# Altium schematic symbol library jlcpcb_2025_04_resistors_extended_2010.schlib: 1697 symbols (part 3 of 9)
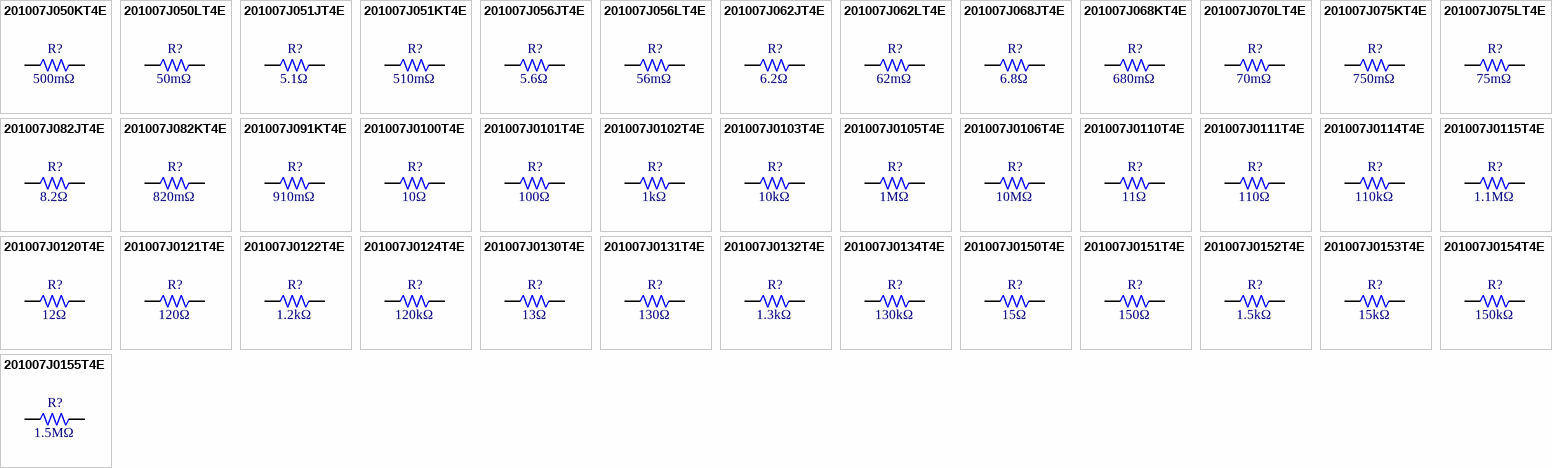
[diagram p44: symbols 201007J050KT4E to 201007J0155T4E]

## 201007J0130T4E
designator R?  Resistance: 13Ω  (hidden comment: *)
Resistor, 13Ω, ±5%, 750mW, 200V, ±200ppm/℃, -55℃~+155℃, SMD 2010; Manufacturer: Uniroyal; Manufacturer Part Number: 201007J0130T4E; Supplier 1: LCSC; Supplier Part Number 1: C406995; JLCPCB Part Number: C406995; Power Rating: 750mW; Category: Resistors; Package Size: 2010; JLCPCB Basic Part: Yes; Tolerance: ±5%; Voltage Rating: 200V; Temperature Coefficient: ±200ppm/℃; Temperature Rating: -55℃~+155℃; ComponentLink1Description: Datasheet; ComponentLink1URL: https://wmsc.lcsc.com/wmsc/upload/file/pdf/v2/lcsc/2205311945_UNI-ROYAL-Uniroyal-Elec-201007J0130T4E_C406995.pdf; ComponentLink2Description: JLCPCB Part URL; ComponentLink2URL: https://jlcpcb.com/partdetail/C406995
pins: 1, 2
1 alternate drawing of the same symbol

## 201007J0131T4E
designator R?  Resistance: 130Ω  (hidden comment: *)
Resistor, 130Ω, ±5%, 750mW, 200V, ±100ppm/℃, -55℃~+155℃, SMD 2010; Manufacturer: Uniroyal; Manufacturer Part Number: 201007J0131T4E; Supplier 1: LCSC; Supplier Part Number 1: C406994; JLCPCB Part Number: C406994; Power Rating: 750mW; Category: Resistors; Package Size: 2010; JLCPCB Basic Part: Yes; Tolerance: ±5%; Voltage Rating: 200V; Temperature Coefficient: ±100ppm/℃; Temperature Rating: -55℃~+155℃; ComponentLink1Description: Datasheet; ComponentLink1URL: https://wmsc.lcsc.com/wmsc/upload/file/pdf/v2/lcsc/2205312300_UNI-ROYAL-Uniroyal-Elec-201007J0131T4E_C406994.pdf; ComponentLink2Description: JLCPCB Part URL; ComponentLink2URL: https://jlcpcb.com/partdetail/C406994
pins: 1, 2
1 alternate drawing of the same symbol

## 201007J0132T4E
designator R?  Resistance: 1.3kΩ  (hidden comment: *)
Resistor, 1.3kΩ, ±5%, 750mW, 200V, ±100ppm/℃, -55℃~+155℃, SMD 2010; Manufacturer: Uniroyal; Manufacturer Part Number: 201007J0132T4E; Supplier 1: LCSC; Supplier Part Number 1: C421747; JLCPCB Part Number: C421747; Power Rating: 750mW; Category: Resistors; Package Size: 2010; JLCPCB Basic Part: Yes; Tolerance: ±5%; Voltage Rating: 200V; Temperature Coefficient: ±100ppm/℃; Temperature Rating: -55℃~+155℃; ComponentLink1Description: Datasheet; ComponentLink1URL: https://wmsc.lcsc.com/wmsc/upload/file/pdf/v2/lcsc/2205312000_UNI-ROYAL-Uniroyal-Elec-201007J0132T4E_C421747.pdf; ComponentLink2Description: JLCPCB Part URL; ComponentLink2URL: https://jlcpcb.com/partdetail/C421747
pins: 1, 2
1 alternate drawing of the same symbol

## 201007J0134T4E
designator R?  Resistance: 130kΩ  (hidden comment: *)
Resistor, 130kΩ, ±5%, 750mW, 200V, ±100ppm/℃, -55℃~+155℃, SMD 2010; Manufacturer: Uniroyal; Manufacturer Part Number: 201007J0134T4E; Supplier 1: LCSC; Supplier Part Number 1: C621164; JLCPCB Part Number: C621164; Power Rating: 750mW; Category: Resistors; Package Size: 2010; JLCPCB Basic Part: Yes; Tolerance: ±5%; Voltage Rating: 200V; Temperature Coefficient: ±100ppm/℃; Temperature Rating: -55℃~+155℃; ComponentLink1Description: Datasheet; ComponentLink1URL: https://wmsc.lcsc.com/wmsc/upload/file/pdf/v2/lcsc/2206011100_UNI-ROYAL-Uniroyal-Elec-201007J0134T4E_C621164.pdf; ComponentLink2Description: JLCPCB Part URL; ComponentLink2URL: https://jlcpcb.com/partdetail/C621164
pins: 1, 2
1 alternate drawing of the same symbol

## 201007J0150T4E
designator R?  Resistance: 15Ω  (hidden comment: *)
Resistor, 15Ω, ±5%, 750mW, 200V, ±100ppm/℃, -55℃~+155℃, SMD 2010; Manufacturer: Uniroyal; Manufacturer Part Number: 201007J0150T4E; Supplier 1: LCSC; Supplier Part Number 1: C473640; JLCPCB Part Number: C473640; Power Rating: 750mW; Category: Resistors; Package Size: 2010; JLCPCB Basic Part: Yes; Tolerance: ±5%; Voltage Rating: 200V; Temperature Coefficient: ±100ppm/℃; Temperature Rating: -55℃~+155℃; ComponentLink1Description: Datasheet; ComponentLink1URL: https://wmsc.lcsc.com/wmsc/upload/file/pdf/v2/lcsc/2206011100_UNI-ROYAL-Uniroyal-Elec-201007J0150T4E_C473640.pdf; ComponentLink2Description: JLCPCB Part URL; ComponentLink2URL: https://jlcpcb.com/partdetail/C473640
pins: 1, 2
1 alternate drawing of the same symbol

## 201007J0151T4E
designator R?  Resistance: 150Ω  (hidden comment: *)
Resistor, 150Ω, ±5%, 750mW, 200V, ±100ppm/℃, -55℃~+155℃, SMD 2010; Manufacturer: Uniroyal; Manufacturer Part Number: 201007J0151T4E; Supplier 1: LCSC; Supplier Part Number 1: C270962; JLCPCB Part Number: C270962; Power Rating: 750mW; Category: Resistors; Package Size: 2010; JLCPCB Basic Part: Yes; Tolerance: ±5%; Voltage Rating: 200V; Temperature Coefficient: ±100ppm/℃; Temperature Rating: -55℃~+155℃; ComponentLink1Description: Datasheet; ComponentLink1URL: https://wmsc.lcsc.com/wmsc/upload/file/pdf/v2/lcsc/2205311945_UNI-ROYAL-Uniroyal-Elec-201007J0151T4E_C270962.pdf; ComponentLink2Description: JLCPCB Part URL; ComponentLink2URL: https://jlcpcb.com/partdetail/C270962
pins: 1, 2
1 alternate drawing of the same symbol

## 201007J0152T4E
designator R?  Resistance: 1.5kΩ  (hidden comment: *)
Resistor, 1.5kΩ, ±5%, 750mW, 200V, ±100ppm/℃, -55℃~+155℃, SMD 2010; Manufacturer: Uniroyal; Manufacturer Part Number: 201007J0152T4E; Supplier 1: LCSC; Supplier Part Number 1: C621149; JLCPCB Part Number: C621149; Power Rating: 750mW; Category: Resistors; Package Size: 2010; JLCPCB Basic Part: Yes; Tolerance: ±5%; Voltage Rating: 200V; Temperature Coefficient: ±100ppm/℃; Temperature Rating: -55℃~+155℃; ComponentLink1Description: Datasheet; ComponentLink1URL: https://wmsc.lcsc.com/wmsc/upload/file/pdf/v2/lcsc/2206011100_UNI-ROYAL-Uniroyal-Elec-201007J0152T4E_C621149.pdf; ComponentLink2Description: JLCPCB Part URL; ComponentLink2URL: https://jlcpcb.com/partdetail/C621149
pins: 1, 2
1 alternate drawing of the same symbol

## 201007J0153T4E
designator R?  Resistance: 15kΩ  (hidden comment: *)
Resistor, 15kΩ, ±5%, 750mW, 200V, ±100ppm/℃, -55℃~+155℃, SMD 2010; Manufacturer: Uniroyal; Manufacturer Part Number: 201007J0153T4E; Supplier 1: LCSC; Supplier Part Number 1: C396642; JLCPCB Part Number: C396642; Power Rating: 750mW; Category: Resistors; Package Size: 2010; JLCPCB Basic Part: Yes; Tolerance: ±5%; Voltage Rating: 200V; Temperature Coefficient: ±100ppm/℃; Temperature Rating: -55℃~+155℃; ComponentLink1Description: Datasheet; ComponentLink1URL: https://wmsc.lcsc.com/wmsc/upload/file/pdf/v2/lcsc/2205311945_UNI-ROYAL-Uniroyal-Elec-201007J0153T4E_C396642.pdf; ComponentLink2Description: JLCPCB Part URL; ComponentLink2URL: https://jlcpcb.com/partdetail/C396642
pins: 1, 2
1 alternate drawing of the same symbol

## 201007J0154T4E
designator R?  Resistance: 150kΩ  (hidden comment: *)
Resistor, 150kΩ, ±5%, 750mW, 200V, ±100ppm/℃, -55℃~+155℃, SMD 2010; Manufacturer: Uniroyal; Manufacturer Part Number: 201007J0154T4E; Supplier 1: LCSC; Supplier Part Number 1: C421744; JLCPCB Part Number: C421744; Power Rating: 750mW; Category: Resistors; Package Size: 2010; JLCPCB Basic Part: Yes; Tolerance: ±5%; Voltage Rating: 200V; Temperature Coefficient: ±100ppm/℃; Temperature Rating: -55℃~+155℃; ComponentLink1Description: Datasheet; ComponentLink1URL: https://wmsc.lcsc.com/wmsc/upload/file/pdf/v2/lcsc/2205312000_UNI-ROYAL-Uniroyal-Elec-201007J0154T4E_C421744.pdf; ComponentLink2Description: JLCPCB Part URL; ComponentLink2URL: https://jlcpcb.com/partdetail/C421744
pins: 1, 2
1 alternate drawing of the same symbol

## 201007J0155T4E
designator R?  Resistance: 1.5MΩ  (hidden comment: *)
Resistor, 1.5MΩ, ±5%, 750mW, 200V, ±100ppm/℃, -55℃~+155℃, SMD 2010; Manufacturer: Uniroyal; Manufacturer Part Number: 201007J0155T4E; Supplier 1: LCSC; Supplier Part Number 1: C421743; JLCPCB Part Number: C421743; Power Rating: 750mW; Category: Resistors; Package Size: 2010; JLCPCB Basic Part: Yes; Tolerance: ±5%; Voltage Rating: 200V; Temperature Coefficient: ±100ppm/℃; Temperature Rating: -55℃~+155℃; ComponentLink1Description: Datasheet; ComponentLink1URL: https://wmsc.lcsc.com/wmsc/upload/file/pdf/v2/lcsc/2205312000_UNI-ROYAL-Uniroyal-Elec-201007J0155T4E_C421743.pdf; ComponentLink2Description: JLCPCB Part URL; ComponentLink2URL: https://jlcpcb.com/partdetail/C421743
pins: 1, 2
1 alternate drawing of the same symbol

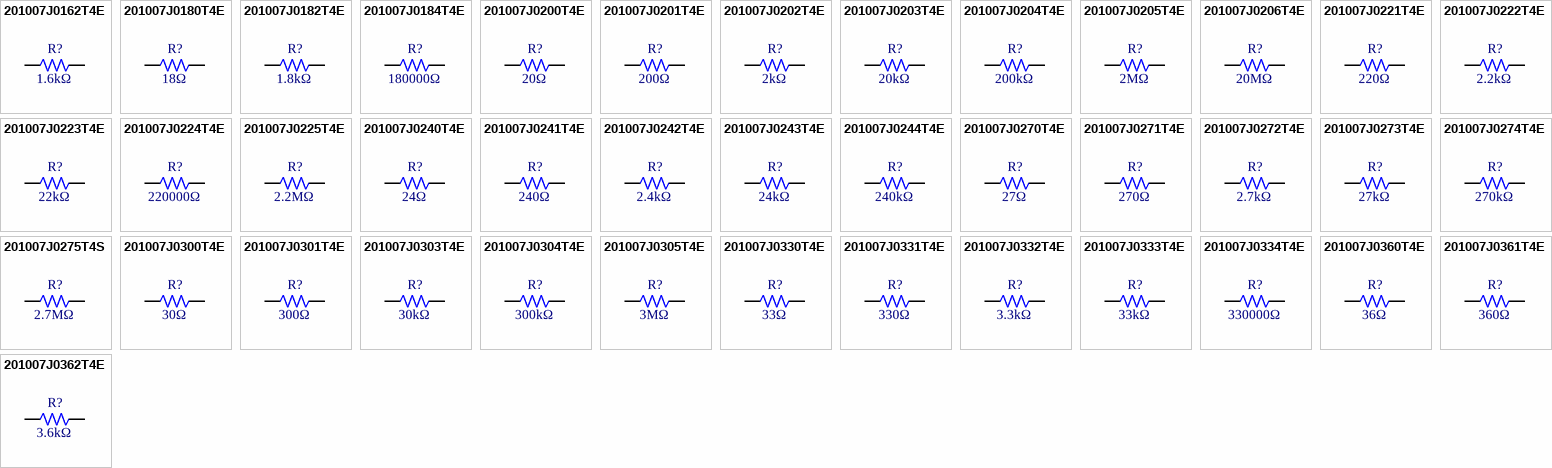
[diagram p10: symbols 201007J0162T4E to 201007J0362T4E]

## 201007J0162T4E
designator R?  Resistance: 1.6kΩ  (hidden comment: *)
Resistor, 1.6kΩ, ±5%, 750mW, 200V, ±100ppm/℃, -55℃~+155℃, SMD 2010; Manufacturer: Uniroyal; Manufacturer Part Number: 201007J0162T4E; Supplier 1: LCSC; Supplier Part Number 1: C621151; JLCPCB Part Number: C621151; Power Rating: 750mW; Category: Resistors; Package Size: 2010; JLCPCB Basic Part: Yes; Tolerance: ±5%; Voltage Rating: 200V; Temperature Coefficient: ±100ppm/℃; Temperature Rating: -55℃~+155℃; ComponentLink1Description: Datasheet; ComponentLink1URL: https://wmsc.lcsc.com/wmsc/upload/file/pdf/v2/lcsc/2206011100_UNI-ROYAL-Uniroyal-Elec-201007J0162T4E_C621151.pdf; ComponentLink2Description: JLCPCB Part URL; ComponentLink2URL: https://jlcpcb.com/partdetail/C621151
pins: 1, 2
1 alternate drawing of the same symbol

## 201007J0180T4E
designator R?  Resistance: 18Ω  (hidden comment: *)
Resistor, 18Ω, ±5%, 750mW, 200V, ±100ppm/℃, -55℃~+155℃, SMD 2010; Manufacturer: Uniroyal; Manufacturer Part Number: 201007J0180T4E; Supplier 1: LCSC; Supplier Part Number 1: C421737; JLCPCB Part Number: C421737; Power Rating: 750mW; Category: Resistors; Package Size: 2010; JLCPCB Basic Part: Yes; Tolerance: ±5%; Voltage Rating: 200V; Temperature Coefficient: ±100ppm/℃; Temperature Rating: -55℃~+155℃; ComponentLink1Description: Datasheet; ComponentLink1URL: https://wmsc.lcsc.com/wmsc/upload/file/pdf/v2/lcsc/2205312000_UNI-ROYAL-Uniroyal-Elec-201007J0180T4E_C421737.pdf; ComponentLink2Description: JLCPCB Part URL; ComponentLink2URL: https://jlcpcb.com/partdetail/C421737
pins: 1, 2
1 alternate drawing of the same symbol

## 201007J0182T4E
designator R?  Resistance: 1.8kΩ  (hidden comment: *)
Resistor, 1.8kΩ, ±5%, 750mW, 200V, ±100ppm/℃, -55℃~+155℃, SMD 2010; Manufacturer: Uniroyal; Manufacturer Part Number: 201007J0182T4E; Supplier 1: LCSC; Supplier Part Number 1: C421735; JLCPCB Part Number: C421735; Power Rating: 750mW; Category: Resistors; Package Size: 2010; JLCPCB Basic Part: Yes; Tolerance: ±5%; Voltage Rating: 200V; Temperature Coefficient: ±100ppm/℃; Temperature Rating: -55℃~+155℃; ComponentLink1Description: Datasheet; ComponentLink1URL: https://wmsc.lcsc.com/wmsc/upload/file/pdf/v2/lcsc/2205312000_UNI-ROYAL-Uniroyal-Elec-201007J0182T4E_C421735.pdf; ComponentLink2Description: JLCPCB Part URL; ComponentLink2URL: https://jlcpcb.com/partdetail/C421735
pins: 1, 2
1 alternate drawing of the same symbol

## 201007J0184T4E
designator R?  Resistance: 180000Ω  (hidden comment: *)
Resistor, 180000Ω, ±5%, 750mW, 200V, ±100ppm/℃, -55℃~+155℃, SMD 2010; Manufacturer: Uniroyal; Manufacturer Part Number: 201007J0184T4E; Supplier 1: LCSC; Supplier Part Number 1: C421734; JLCPCB Part Number: C421734; Power Rating: 750mW; Category: Resistors; Package Size: 2010; JLCPCB Basic Part: Yes; Tolerance: ±5%; Voltage Rating: 200V; Temperature Coefficient: ±100ppm/℃; Temperature Rating: -55℃~+155℃; ComponentLink1Description: Datasheet; ComponentLink1URL: https://wmsc.lcsc.com/wmsc/upload/file/pdf/v2/lcsc/2205312000_UNI-ROYAL-Uniroyal-Elec-201007J0184T4E_C421734.pdf; ComponentLink2Description: JLCPCB Part URL; ComponentLink2URL: https://jlcpcb.com/partdetail/C421734
pins: 1, 2
1 alternate drawing of the same symbol

## 201007J0200T4E
designator R?  Resistance: 20Ω  (hidden comment: *)
Resistor, 20Ω, ±5%, 750mW, 200V, ±100ppm/℃, -55℃~+155℃, SMD 2010; Manufacturer: Uniroyal; Manufacturer Part Number: 201007J0200T4E; Supplier 1: LCSC; Supplier Part Number 1: C473651; JLCPCB Part Number: C473651; Power Rating: 750mW; Category: Resistors; Package Size: 2010; JLCPCB Basic Part: Yes; Tolerance: ±5%; Voltage Rating: 200V; Temperature Coefficient: ±100ppm/℃; Temperature Rating: -55℃~+155℃; ComponentLink1Description: Datasheet; ComponentLink1URL: https://wmsc.lcsc.com/wmsc/upload/file/pdf/v2/lcsc/2206011100_UNI-ROYAL-Uniroyal-Elec-201007J0200T4E_C473651.pdf; ComponentLink2Description: JLCPCB Part URL; ComponentLink2URL: https://jlcpcb.com/partdetail/C473651
pins: 1, 2
1 alternate drawing of the same symbol

## 201007J0201T4E
designator R?  Resistance: 200Ω  (hidden comment: *)
Resistor, 200Ω, ±5%, 750mW, 200V, ±100ppm/℃, -55℃~+155℃, SMD 2010; Manufacturer: Uniroyal; Manufacturer Part Number: 201007J0201T4E; Supplier 1: LCSC; Supplier Part Number 1: C19610; JLCPCB Part Number: C19610; Power Rating: 750mW; Category: Resistors; Package Size: 2010; JLCPCB Basic Part: Yes; Tolerance: ±5%; Voltage Rating: 200V; Temperature Coefficient: ±100ppm/℃; Temperature Rating: -55℃~+155℃; ComponentLink1Description: Datasheet; ComponentLink1URL: https://wmsc.lcsc.com/wmsc/upload/file/pdf/v2/lcsc/2206010145_UNI-ROYAL-Uniroyal-Elec-201007J0201T4E_C19610.pdf; ComponentLink2Description: JLCPCB Part URL; ComponentLink2URL: https://jlcpcb.com/partdetail/C19610
pins: 1, 2
1 alternate drawing of the same symbol

## 201007J0202T4E
designator R?  Resistance: 2kΩ  (hidden comment: *)
Resistor, 2kΩ, ±5%, 750mW, 200V, ±100ppm/℃, -55℃~+155℃, SMD 2010; Manufacturer: Uniroyal; Manufacturer Part Number: 201007J0202T4E; Supplier 1: LCSC; Supplier Part Number 1: C270960; JLCPCB Part Number: C270960; Power Rating: 750mW; Category: Resistors; Package Size: 2010; JLCPCB Basic Part: Yes; Tolerance: ±5%; Voltage Rating: 200V; Temperature Coefficient: ±100ppm/℃; Temperature Rating: -55℃~+155℃; ComponentLink1Description: Datasheet; ComponentLink1URL: https://wmsc.lcsc.com/wmsc/upload/file/pdf/v2/lcsc/2205311945_UNI-ROYAL-Uniroyal-Elec-201007J0202T4E_C270960.pdf; ComponentLink2Description: JLCPCB Part URL; ComponentLink2URL: https://jlcpcb.com/partdetail/C270960
pins: 1, 2
1 alternate drawing of the same symbol

## 201007J0203T4E
designator R?  Resistance: 20kΩ  (hidden comment: *)
Resistor, 20kΩ, ±5%, 750mW, 200V, ±100ppm/℃, -55℃~+155℃, SMD 2010; Manufacturer: Uniroyal; Manufacturer Part Number: 201007J0203T4E; Supplier 1: LCSC; Supplier Part Number 1: C621184; JLCPCB Part Number: C621184; Power Rating: 750mW; Category: Resistors; Package Size: 2010; JLCPCB Basic Part: Yes; Tolerance: ±5%; Voltage Rating: 200V; Temperature Coefficient: ±100ppm/℃; Temperature Rating: -55℃~+155℃; ComponentLink1Description: Datasheet; ComponentLink1URL: https://wmsc.lcsc.com/wmsc/upload/file/pdf/v2/lcsc/2206011100_UNI-ROYAL-Uniroyal-Elec-201007J0203T4E_C621184.pdf; ComponentLink2Description: JLCPCB Part URL; ComponentLink2URL: https://jlcpcb.com/partdetail/C621184
pins: 1, 2
1 alternate drawing of the same symbol

## 201007J0204T4E
designator R?  Resistance: 200kΩ  (hidden comment: *)
Resistor, 200kΩ, ±5%, 750mW, 200V, ±100ppm/℃, -55℃~+155℃, SMD 2010; Manufacturer: Uniroyal; Manufacturer Part Number: 201007J0204T4E; Supplier 1: LCSC; Supplier Part Number 1: C421733; JLCPCB Part Number: C421733; Power Rating: 750mW; Category: Resistors; Package Size: 2010; JLCPCB Basic Part: Yes; Tolerance: ±5%; Voltage Rating: 200V; Temperature Coefficient: ±100ppm/℃; Temperature Rating: -55℃~+155℃; ComponentLink1Description: Datasheet; ComponentLink1URL: https://wmsc.lcsc.com/wmsc/upload/file/pdf/v2/lcsc/2205312000_UNI-ROYAL-Uniroyal-Elec-201007J0204T4E_C421733.pdf; ComponentLink2Description: JLCPCB Part URL; ComponentLink2URL: https://jlcpcb.com/partdetail/C421733
pins: 1, 2
1 alternate drawing of the same symbol

## 201007J0205T4E
designator R?  Resistance: 2MΩ  (hidden comment: *)
Resistor, 2MΩ, ±5%, 750mW, 200V, ±100ppm/℃, -55℃~+155℃, SMD 2010; Manufacturer: Uniroyal; Manufacturer Part Number: 201007J0205T4E; Supplier 1: LCSC; Supplier Part Number 1: C421732; JLCPCB Part Number: C421732; Power Rating: 750mW; Category: Resistors; Package Size: 2010; JLCPCB Basic Part: Yes; Tolerance: ±5%; Voltage Rating: 200V; Temperature Coefficient: ±100ppm/℃; Temperature Rating: -55℃~+155℃; ComponentLink1Description: Datasheet; ComponentLink1URL: https://wmsc.lcsc.com/wmsc/upload/file/pdf/v2/lcsc/2205312000_UNI-ROYAL-Uniroyal-Elec-201007J0205T4E_C421732.pdf; ComponentLink2Description: JLCPCB Part URL; ComponentLink2URL: https://jlcpcb.com/partdetail/C421732
pins: 1, 2
1 alternate drawing of the same symbol

## 201007J0206T4E
designator R?  Resistance: 20MΩ  (hidden comment: *)
Resistor, 20MΩ, ±5%, 750mW, 200V, ±100ppm/℃, -55℃~+155℃, SMD 2010; Manufacturer: Uniroyal; Manufacturer Part Number: 201007J0206T4E; Supplier 1: LCSC; Supplier Part Number 1: C2768917; JLCPCB Part Number: C2768917; Power Rating: 750mW; Category: Resistors; Package Size: 2010; JLCPCB Basic Part: Yes; Tolerance: ±5%; Voltage Rating: 200V; Temperature Coefficient: ±100ppm/℃; Temperature Rating: -55℃~+155℃; ComponentLink1Description: Datasheet; ComponentLink1URL: https://wmsc.lcsc.com/wmsc/upload/file/pdf/v2/lcsc/2206011016_UNI-ROYAL-Uniroyal-Elec-201007J0206T4E_C2768917.pdf; ComponentLink2Description: JLCPCB Part URL; ComponentLink2URL: https://jlcpcb.com/partdetail/C2768917
pins: 1, 2
1 alternate drawing of the same symbol

## 201007J0221T4E
designator R?  Resistance: 220Ω  (hidden comment: *)
Resistor, 220Ω, ±5%, 750mW, 200V, ±100ppm/℃, -55℃~+155℃, SMD 2010; Manufacturer: Uniroyal; Manufacturer Part Number: 201007J0221T4E; Supplier 1: LCSC; Supplier Part Number 1: C621186; JLCPCB Part Number: C621186; Power Rating: 750mW; Category: Resistors; Package Size: 2010; JLCPCB Basic Part: Yes; Tolerance: ±5%; Voltage Rating: 200V; Temperature Coefficient: ±100ppm/℃; Temperature Rating: -55℃~+155℃; ComponentLink1Description: Datasheet; ComponentLink1URL: https://wmsc.lcsc.com/wmsc/upload/file/pdf/v2/lcsc/2206011100_UNI-ROYAL-Uniroyal-Elec-201007J0221T4E_C621186.pdf; ComponentLink2Description: JLCPCB Part URL; ComponentLink2URL: https://jlcpcb.com/partdetail/C621186
pins: 1, 2
1 alternate drawing of the same symbol

## 201007J0222T4E
designator R?  Resistance: 2.2kΩ  (hidden comment: *)
Resistor, 2.2kΩ, ±5%, 750mW, 200V, ±100ppm/℃, -55℃~+155℃, SMD 2010; Manufacturer: Uniroyal; Manufacturer Part Number: 201007J0222T4E; Supplier 1: LCSC; Supplier Part Number 1: C621177; JLCPCB Part Number: C621177; Power Rating: 750mW; Category: Resistors; Package Size: 2010; JLCPCB Basic Part: Yes; Tolerance: ±5%; Voltage Rating: 200V; Temperature Coefficient: ±100ppm/℃; Temperature Rating: -55℃~+155℃; ComponentLink1Description: Datasheet; ComponentLink1URL: https://wmsc.lcsc.com/wmsc/upload/file/pdf/v2/lcsc/2206011100_UNI-ROYAL-Uniroyal-Elec-201007J0222T4E_C621177.pdf; ComponentLink2Description: JLCPCB Part URL; ComponentLink2URL: https://jlcpcb.com/partdetail/C621177
pins: 1, 2
1 alternate drawing of the same symbol

## 201007J0223T4E
designator R?  Resistance: 22kΩ  (hidden comment: *)
Resistor, 22kΩ, ±5%, 750mW, 200V, ±100ppm/℃, -55℃~+155℃, SMD 2010; Manufacturer: Uniroyal; Manufacturer Part Number: 201007J0223T4E; Supplier 1: LCSC; Supplier Part Number 1: C421731; JLCPCB Part Number: C421731; Power Rating: 750mW; Category: Resistors; Package Size: 2010; JLCPCB Basic Part: Yes; Tolerance: ±5%; Voltage Rating: 200V; Temperature Coefficient: ±100ppm/℃; Temperature Rating: -55℃~+155℃; ComponentLink1Description: Datasheet; ComponentLink1URL: https://wmsc.lcsc.com/wmsc/upload/file/pdf/v2/lcsc/2205312000_UNI-ROYAL-Uniroyal-Elec-201007J0223T4E_C421731.pdf; ComponentLink2Description: JLCPCB Part URL; ComponentLink2URL: https://jlcpcb.com/partdetail/C421731
pins: 1, 2
1 alternate drawing of the same symbol

## 201007J0224T4E
designator R?  Resistance: 220000Ω  (hidden comment: *)
Resistor, 220000Ω, ±5%, 750mW, 200V, ±100ppm/℃, -55℃~+155℃, SMD 2010; Manufacturer: Uniroyal; Manufacturer Part Number: 201007J0224T4E; Supplier 1: LCSC; Supplier Part Number 1: C2692685; JLCPCB Part Number: C2692685; Power Rating: 750mW; Category: Resistors; Package Size: 2010; JLCPCB Basic Part: Yes; Tolerance: ±5%; Voltage Rating: 200V; Temperature Coefficient: ±100ppm/℃; Temperature Rating: -55℃~+155℃; ComponentLink1Description: Datasheet; ComponentLink1URL: https://wmsc.lcsc.com/wmsc/upload/file/pdf/v2/lcsc/2206011045_UNI-ROYAL-Uniroyal-Elec-201007J0224T4E_C2692685.pdf; ComponentLink2Description: JLCPCB Part URL; ComponentLink2URL: https://jlcpcb.com/partdetail/C2692685
pins: 1, 2
1 alternate drawing of the same symbol

## 201007J0225T4E
designator R?  Resistance: 2.2MΩ  (hidden comment: *)
Resistor, 2.2MΩ, ±5%, 750mW, 200V, ±100ppm/℃, -55℃~+155℃, SMD 2010; Manufacturer: Uniroyal; Manufacturer Part Number: 201007J0225T4E; Supplier 1: LCSC; Supplier Part Number 1: C406986; JLCPCB Part Number: C406986; Power Rating: 750mW; Category: Resistors; Package Size: 2010; JLCPCB Basic Part: Yes; Tolerance: ±5%; Voltage Rating: 200V; Temperature Coefficient: ±100ppm/℃; Temperature Rating: -55℃~+155℃; ComponentLink1Description: Datasheet; ComponentLink1URL: https://wmsc.lcsc.com/wmsc/upload/file/pdf/v2/lcsc/2205312300_UNI-ROYAL-Uniroyal-Elec-201007J0225T4E_C406986.pdf; ComponentLink2Description: JLCPCB Part URL; ComponentLink2URL: https://jlcpcb.com/partdetail/C406986
pins: 1, 2
1 alternate drawing of the same symbol

## 201007J0240T4E
designator R?  Resistance: 24Ω  (hidden comment: *)
Resistor, 24Ω, ±5%, 750mW, 200V, ±100ppm/℃, -55℃~+155℃, SMD 2010; Manufacturer: Uniroyal; Manufacturer Part Number: 201007J0240T4E; Supplier 1: LCSC; Supplier Part Number 1: C421729; JLCPCB Part Number: C421729; Power Rating: 750mW; Category: Resistors; Package Size: 2010; JLCPCB Basic Part: Yes; Tolerance: ±5%; Voltage Rating: 200V; Temperature Coefficient: ±100ppm/℃; Temperature Rating: -55℃~+155℃; ComponentLink1Description: Datasheet; ComponentLink1URL: https://wmsc.lcsc.com/wmsc/upload/file/pdf/v2/lcsc/2205312000_UNI-ROYAL-Uniroyal-Elec-201007J0240T4E_C421729.pdf; ComponentLink2Description: JLCPCB Part URL; ComponentLink2URL: https://jlcpcb.com/partdetail/C421729
pins: 1, 2
1 alternate drawing of the same symbol

## 201007J0241T4E
designator R?  Resistance: 240Ω  (hidden comment: *)
Resistor, 240Ω, ±5%, 750mW, 200V, ±100ppm/℃, -55℃~+155℃, SMD 2010; Manufacturer: Uniroyal; Manufacturer Part Number: 201007J0241T4E; Supplier 1: LCSC; Supplier Part Number 1: C621189; JLCPCB Part Number: C621189; Power Rating: 750mW; Category: Resistors; Package Size: 2010; JLCPCB Basic Part: Yes; Tolerance: ±5%; Voltage Rating: 200V; Temperature Coefficient: ±100ppm/℃; Temperature Rating: -55℃~+155℃; ComponentLink1Description: Datasheet; ComponentLink1URL: https://wmsc.lcsc.com/wmsc/upload/file/pdf/v2/lcsc/2206011100_UNI-ROYAL-Uniroyal-Elec-201007J0241T4E_C621189.pdf; ComponentLink2Description: JLCPCB Part URL; ComponentLink2URL: https://jlcpcb.com/partdetail/C621189
pins: 1, 2
1 alternate drawing of the same symbol

## 201007J0242T4E
designator R?  Resistance: 2.4kΩ  (hidden comment: *)
Resistor, 2.4kΩ, ±5%, 750mW, 200V, ±100ppm/℃, -55℃~+155℃, SMD 2010; Manufacturer: Uniroyal; Manufacturer Part Number: 201007J0242T4E; Supplier 1: LCSC; Supplier Part Number 1: C621178; JLCPCB Part Number: C621178; Power Rating: 750mW; Category: Resistors; Package Size: 2010; JLCPCB Basic Part: Yes; Tolerance: ±5%; Voltage Rating: 200V; Temperature Coefficient: ±100ppm/℃; Temperature Rating: -55℃~+155℃; ComponentLink1Description: Datasheet; ComponentLink1URL: https://wmsc.lcsc.com/wmsc/upload/file/pdf/v2/lcsc/2206011100_UNI-ROYAL-Uniroyal-Elec-201007J0242T4E_C621178.pdf; ComponentLink2Description: JLCPCB Part URL; ComponentLink2URL: https://jlcpcb.com/partdetail/C621178
pins: 1, 2
1 alternate drawing of the same symbol

## 201007J0243T4E
designator R?  Resistance: 24kΩ  (hidden comment: *)
Resistor, 24kΩ, ±5%, 750mW, 200V, ±100ppm/℃, -55℃~+155℃, SMD 2010; Manufacturer: Uniroyal; Manufacturer Part Number: 201007J0243T4E; Supplier 1: LCSC; Supplier Part Number 1: C406985; JLCPCB Part Number: C406985; Power Rating: 750mW; Category: Resistors; Package Size: 2010; JLCPCB Basic Part: Yes; Tolerance: ±5%; Voltage Rating: 200V; Temperature Coefficient: ±100ppm/℃; Temperature Rating: -55℃~+155℃; ComponentLink1Description: Datasheet; ComponentLink1URL: https://wmsc.lcsc.com/wmsc/upload/file/pdf/v2/lcsc/2205312300_UNI-ROYAL-Uniroyal-Elec-201007J0243T4E_C406985.pdf; ComponentLink2Description: JLCPCB Part URL; ComponentLink2URL: https://jlcpcb.com/partdetail/C406985
pins: 1, 2
1 alternate drawing of the same symbol

## 201007J0244T4E
designator R?  Resistance: 240kΩ  (hidden comment: *)
Resistor, 240kΩ, ±5%, 750mW, 200V, ±100ppm/℃, -55℃~+155℃, SMD 2010; Manufacturer: Uniroyal; Manufacturer Part Number: 201007J0244T4E; Supplier 1: LCSC; Supplier Part Number 1: C406984; JLCPCB Part Number: C406984; Power Rating: 750mW; Category: Resistors; Package Size: 2010; JLCPCB Basic Part: Yes; Tolerance: ±5%; Voltage Rating: 200V; Temperature Coefficient: ±100ppm/℃; Temperature Rating: -55℃~+155℃; ComponentLink1Description: Datasheet; ComponentLink1URL: https://wmsc.lcsc.com/wmsc/upload/file/pdf/v2/lcsc/2205312300_UNI-ROYAL-Uniroyal-Elec-201007J0244T4E_C406984.pdf; ComponentLink2Description: JLCPCB Part URL; ComponentLink2URL: https://jlcpcb.com/partdetail/C406984
pins: 1, 2
1 alternate drawing of the same symbol

## 201007J0270T4E
designator R?  Resistance: 27Ω  (hidden comment: *)
Resistor, 27Ω, ±5%, 750mW, 200V, ±100ppm/℃, -55℃~+155℃, SMD 2010; Manufacturer: Uniroyal; Manufacturer Part Number: 201007J0270T4E; Supplier 1: LCSC; Supplier Part Number 1: C621193; JLCPCB Part Number: C621193; Power Rating: 750mW; Category: Resistors; Package Size: 2010; JLCPCB Basic Part: Yes; Tolerance: ±5%; Voltage Rating: 200V; Temperature Coefficient: ±100ppm/℃; Temperature Rating: -55℃~+155℃; ComponentLink1Description: Datasheet; ComponentLink1URL: https://wmsc.lcsc.com/wmsc/upload/file/pdf/v2/lcsc/2206011100_UNI-ROYAL-Uniroyal-Elec-201007J0270T4E_C621193.pdf; ComponentLink2Description: JLCPCB Part URL; ComponentLink2URL: https://jlcpcb.com/partdetail/C621193
pins: 1, 2
1 alternate drawing of the same symbol

## 201007J0271T4E
designator R?  Resistance: 270Ω  (hidden comment: *)
Resistor, 270Ω, ±5%, 750mW, 200V, ±100ppm/℃, -55℃~+155℃, SMD 2010; Manufacturer: Uniroyal; Manufacturer Part Number: 201007J0271T4E; Supplier 1: LCSC; Supplier Part Number 1: C621191; JLCPCB Part Number: C621191; Power Rating: 750mW; Category: Resistors; Package Size: 2010; JLCPCB Basic Part: Yes; Tolerance: ±5%; Voltage Rating: 200V; Temperature Coefficient: ±100ppm/℃; Temperature Rating: -55℃~+155℃; ComponentLink1Description: Datasheet; ComponentLink1URL: https://wmsc.lcsc.com/wmsc/upload/file/pdf/v2/lcsc/2206011100_UNI-ROYAL-Uniroyal-Elec-201007J0271T4E_C621191.pdf; ComponentLink2Description: JLCPCB Part URL; ComponentLink2URL: https://jlcpcb.com/partdetail/C621191
pins: 1, 2
1 alternate drawing of the same symbol

## 201007J0272T4E
designator R?  Resistance: 2.7kΩ  (hidden comment: *)
Resistor, 2.7kΩ, ±5%, 750mW, 200V, ±1000ppm/℃, -55℃~+155℃, SMD 2010; Manufacturer: Uniroyal; Manufacturer Part Number: 201007J0272T4E; Supplier 1: LCSC; Supplier Part Number 1: C421727; JLCPCB Part Number: C421727; Power Rating: 750mW; Category: Resistors; Package Size: 2010; JLCPCB Basic Part: Yes; Tolerance: ±5%; Voltage Rating: 200V; Temperature Coefficient: ±1000ppm/℃; Temperature Rating: -55℃~+155℃; ComponentLink1Description: Datasheet; ComponentLink1URL: https://wmsc.lcsc.com/wmsc/upload/file/pdf/v2/lcsc/2205312000_UNI-ROYAL-Uniroyal-Elec-201007J0272T4E_C421727.pdf; ComponentLink2Description: JLCPCB Part URL; ComponentLink2URL: https://jlcpcb.com/partdetail/C421727
pins: 1, 2
1 alternate drawing of the same symbol

## 201007J0273T4E
designator R?  Resistance: 27kΩ  (hidden comment: *)
Resistor, 27kΩ, ±5%, 750mW, 200V, ±100ppm/℃, -55℃~+155℃, SMD 2010; Manufacturer: Uniroyal; Manufacturer Part Number: 201007J0273T4E; Supplier 1: LCSC; Supplier Part Number 1: C421726; JLCPCB Part Number: C421726; Power Rating: 750mW; Category: Resistors; Package Size: 2010; JLCPCB Basic Part: Yes; Tolerance: ±5%; Voltage Rating: 200V; Temperature Coefficient: ±100ppm/℃; Temperature Rating: -55℃~+155℃; ComponentLink1Description: Datasheet; ComponentLink1URL: https://wmsc.lcsc.com/wmsc/upload/file/pdf/v2/lcsc/2205312000_UNI-ROYAL-Uniroyal-Elec-201007J0273T4E_C421726.pdf; ComponentLink2Description: JLCPCB Part URL; ComponentLink2URL: https://jlcpcb.com/partdetail/C421726
pins: 1, 2
1 alternate drawing of the same symbol

## 201007J0274T4E
designator R?  Resistance: 270kΩ  (hidden comment: *)
Resistor, 270kΩ, ±5%, 750mW, 200V, ±100ppm/℃, -55℃~+155℃, SMD 2010; Manufacturer: Uniroyal; Manufacturer Part Number: 201007J0274T4E; Supplier 1: LCSC; Supplier Part Number 1: C421725; JLCPCB Part Number: C421725; Power Rating: 750mW; Category: Resistors; Package Size: 2010; JLCPCB Basic Part: Yes; Tolerance: ±5%; Voltage Rating: 200V; Temperature Coefficient: ±100ppm/℃; Temperature Rating: -55℃~+155℃; ComponentLink1Description: Datasheet; ComponentLink1URL: https://wmsc.lcsc.com/wmsc/upload/file/pdf/v2/lcsc/2205312000_UNI-ROYAL-Uniroyal-Elec-201007J0274T4E_C421725.pdf; ComponentLink2Description: JLCPCB Part URL; ComponentLink2URL: https://jlcpcb.com/partdetail/C421725
pins: 1, 2
1 alternate drawing of the same symbol

## 201007J0275T4S
designator R?  Resistance: 2.7MΩ  (hidden comment: *)
Resistor, 2.7MΩ, ±5%, 200V, -55℃~+155℃, SMD 2010; Manufacturer: Uniroyal; Manufacturer Part Number: 201007J0275T4S; Supplier 1: LCSC; Supplier Part Number 1: C73666; JLCPCB Part Number: C73666; Category: Resistors; Package Size: 2010; JLCPCB Basic Part: Yes; Tolerance: ±5%; Voltage Rating: 200V; Temperature Rating: -55℃~+155℃; ComponentLink1Description: Datasheet; ComponentLink1URL: https://wmsc.lcsc.com/wmsc/upload/file/pdf/v2/lcsc/2304140030_UNI-ROYAL-Uniroyal-Elec-201007J0275T4S_C73666.pdf; ComponentLink2Description: JLCPCB Part URL; ComponentLink2URL: https://jlcpcb.com/partdetail/C73666
pins: 1, 2
1 alternate drawing of the same symbol

## 201007J0300T4E
designator R?  Resistance: 30Ω  (hidden comment: *)
Resistor, 30Ω, ±5%, 750mW, 200V, ±100ppm/℃, -55℃~+155℃, SMD 2010; Manufacturer: Uniroyal; Manufacturer Part Number: 201007J0300T4E; Supplier 1: LCSC; Supplier Part Number 1: C621205; JLCPCB Part Number: C621205; Power Rating: 750mW; Category: Resistors; Package Size: 2010; JLCPCB Basic Part: Yes; Tolerance: ±5%; Voltage Rating: 200V; Temperature Coefficient: ±100ppm/℃; Temperature Rating: -55℃~+155℃; ComponentLink1Description: Datasheet; ComponentLink1URL: https://wmsc.lcsc.com/wmsc/upload/file/pdf/v2/lcsc/2206011100_UNI-ROYAL-Uniroyal-Elec-201007J0300T4E_C621205.pdf; ComponentLink2Description: JLCPCB Part URL; ComponentLink2URL: https://jlcpcb.com/partdetail/C621205
pins: 1, 2
1 alternate drawing of the same symbol

## 201007J0301T4E
designator R?  Resistance: 300Ω  (hidden comment: *)
Resistor, 300Ω, ±5%, 750mW, 200V, ±100ppm/℃, -55℃~+155℃, SMD 2010; Manufacturer: Uniroyal; Manufacturer Part Number: 201007J0301T4E; Supplier 1: LCSC; Supplier Part Number 1: C421723; JLCPCB Part Number: C421723; Power Rating: 750mW; Category: Resistors; Package Size: 2010; JLCPCB Basic Part: Yes; Tolerance: ±5%; Voltage Rating: 200V; Temperature Coefficient: ±100ppm/℃; Temperature Rating: -55℃~+155℃; ComponentLink1Description: Datasheet; ComponentLink1URL: https://wmsc.lcsc.com/wmsc/upload/file/pdf/v2/lcsc/2205312000_UNI-ROYAL-Uniroyal-Elec-201007J0301T4E_C421723.pdf; ComponentLink2Description: JLCPCB Part URL; ComponentLink2URL: https://jlcpcb.com/partdetail/C421723
pins: 1, 2
1 alternate drawing of the same symbol

## 201007J0303T4E
designator R?  Resistance: 30kΩ  (hidden comment: *)
Resistor, 30kΩ, ±5%, 750mW, 200V, ±100ppm/℃, -55℃~+155℃, SMD 2010; Manufacturer: Uniroyal; Manufacturer Part Number: 201007J0303T4E; Supplier 1: LCSC; Supplier Part Number 1: C621204; JLCPCB Part Number: C621204; Power Rating: 750mW; Category: Resistors; Package Size: 2010; JLCPCB Basic Part: Yes; Tolerance: ±5%; Voltage Rating: 200V; Temperature Coefficient: ±100ppm/℃; Temperature Rating: -55℃~+155℃; ComponentLink1Description: Datasheet; ComponentLink1URL: https://wmsc.lcsc.com/wmsc/upload/file/pdf/v2/lcsc/2206011100_UNI-ROYAL-Uniroyal-Elec-201007J0303T4E_C621204.pdf; ComponentLink2Description: JLCPCB Part URL; ComponentLink2URL: https://jlcpcb.com/partdetail/C621204
pins: 1, 2
1 alternate drawing of the same symbol

## 201007J0304T4E
designator R?  Resistance: 300kΩ  (hidden comment: *)
Resistor, 300kΩ, ±5%, 750mW, 200V, ±100ppm/℃, -55℃~+155℃, SMD 2010; Manufacturer: Uniroyal; Manufacturer Part Number: 201007J0304T4E; Supplier 1: LCSC; Supplier Part Number 1: C421722; JLCPCB Part Number: C421722; Power Rating: 750mW; Category: Resistors; Package Size: 2010; JLCPCB Basic Part: Yes; Tolerance: ±5%; Voltage Rating: 200V; Temperature Coefficient: ±100ppm/℃; Temperature Rating: -55℃~+155℃; ComponentLink1Description: Datasheet; ComponentLink1URL: https://wmsc.lcsc.com/wmsc/upload/file/pdf/v2/lcsc/2205312000_UNI-ROYAL-Uniroyal-Elec-201007J0304T4E_C421722.pdf; ComponentLink2Description: JLCPCB Part URL; ComponentLink2URL: https://jlcpcb.com/partdetail/C421722
pins: 1, 2
1 alternate drawing of the same symbol

## 201007J0305T4E
designator R?  Resistance: 3MΩ  (hidden comment: *)
Resistor, 3MΩ, ±5%, 750mW, 200V, ±100ppm/℃, -55℃~+155℃, SMD 2010; Manufacturer: Uniroyal; Manufacturer Part Number: 201007J0305T4E; Supplier 1: LCSC; Supplier Part Number 1: C421721; JLCPCB Part Number: C421721; Power Rating: 750mW; Category: Resistors; Package Size: 2010; JLCPCB Basic Part: Yes; Tolerance: ±5%; Voltage Rating: 200V; Temperature Coefficient: ±100ppm/℃; Temperature Rating: -55℃~+155℃; ComponentLink1Description: Datasheet; ComponentLink1URL: https://wmsc.lcsc.com/wmsc/upload/file/pdf/v2/lcsc/2205312000_UNI-ROYAL-Uniroyal-Elec-201007J0305T4E_C421721.pdf; ComponentLink2Description: JLCPCB Part URL; ComponentLink2URL: https://jlcpcb.com/partdetail/C421721
pins: 1, 2
1 alternate drawing of the same symbol

## 201007J0330T4E
designator R?  Resistance: 33Ω  (hidden comment: *)
Resistor, 33Ω, ±5%, 750mW, 200V, ±100ppm/℃, -55℃~+155℃, SMD 2010; Manufacturer: Uniroyal; Manufacturer Part Number: 201007J0330T4E; Supplier 1: LCSC; Supplier Part Number 1: C406980; JLCPCB Part Number: C406980; Power Rating: 750mW; Category: Resistors; Package Size: 2010; JLCPCB Basic Part: Yes; Tolerance: ±5%; Voltage Rating: 200V; Temperature Coefficient: ±100ppm/℃; Temperature Rating: -55℃~+155℃; ComponentLink1Description: Datasheet; ComponentLink1URL: https://wmsc.lcsc.com/wmsc/upload/file/pdf/v2/lcsc/2205312300_UNI-ROYAL-Uniroyal-Elec-201007J0330T4E_C406980.pdf; ComponentLink2Description: JLCPCB Part URL; ComponentLink2URL: https://jlcpcb.com/partdetail/C406980
pins: 1, 2
1 alternate drawing of the same symbol

## 201007J0331T4E
designator R?  Resistance: 330Ω  (hidden comment: *)
Resistor, 330Ω, ±5%, 750mW, 200V, ±100ppm/℃, -55℃~+155℃, SMD 2010; Manufacturer: Uniroyal; Manufacturer Part Number: 201007J0331T4E; Supplier 1: LCSC; Supplier Part Number 1: C421719; JLCPCB Part Number: C421719; Power Rating: 750mW; Category: Resistors; Package Size: 2010; JLCPCB Basic Part: Yes; Tolerance: ±5%; Voltage Rating: 200V; Temperature Coefficient: ±100ppm/℃; Temperature Rating: -55℃~+155℃; ComponentLink1Description: Datasheet; ComponentLink1URL: https://wmsc.lcsc.com/wmsc/upload/file/pdf/v2/lcsc/2205312000_UNI-ROYAL-Uniroyal-Elec-201007J0331T4E_C421719.pdf; ComponentLink2Description: JLCPCB Part URL; ComponentLink2URL: https://jlcpcb.com/partdetail/C421719
pins: 1, 2
1 alternate drawing of the same symbol

## 201007J0332T4E
designator R?  Resistance: 3.3kΩ  (hidden comment: *)
Resistor, 3.3kΩ, ±5%, 750mW, 200V, ±100ppm/℃, -55℃~+155℃, SMD 2010; Manufacturer: Uniroyal; Manufacturer Part Number: 201007J0332T4E; Supplier 1: LCSC; Supplier Part Number 1: C621197; JLCPCB Part Number: C621197; Power Rating: 750mW; Category: Resistors; Package Size: 2010; JLCPCB Basic Part: Yes; Tolerance: ±5%; Voltage Rating: 200V; Temperature Coefficient: ±100ppm/℃; Temperature Rating: -55℃~+155℃; ComponentLink1Description: Datasheet; ComponentLink1URL: https://wmsc.lcsc.com/wmsc/upload/file/pdf/v2/lcsc/2206011100_UNI-ROYAL-Uniroyal-Elec-201007J0332T4E_C621197.pdf; ComponentLink2Description: JLCPCB Part URL; ComponentLink2URL: https://jlcpcb.com/partdetail/C621197
pins: 1, 2
1 alternate drawing of the same symbol